# Altium footprint library chipfc_libs.PCBLIB: 337 footprints (part 3 of 22)
Each footprint in its own frame and in the unit in brackets; x right, y up, seen from the top. Pads: shape width x height; smd on the part's side, far side on the other; paste and mask are expansions set on the pad; w line width, h text height; cw(c..) or ccw(c..) is an arc to the next point about the centre after c.
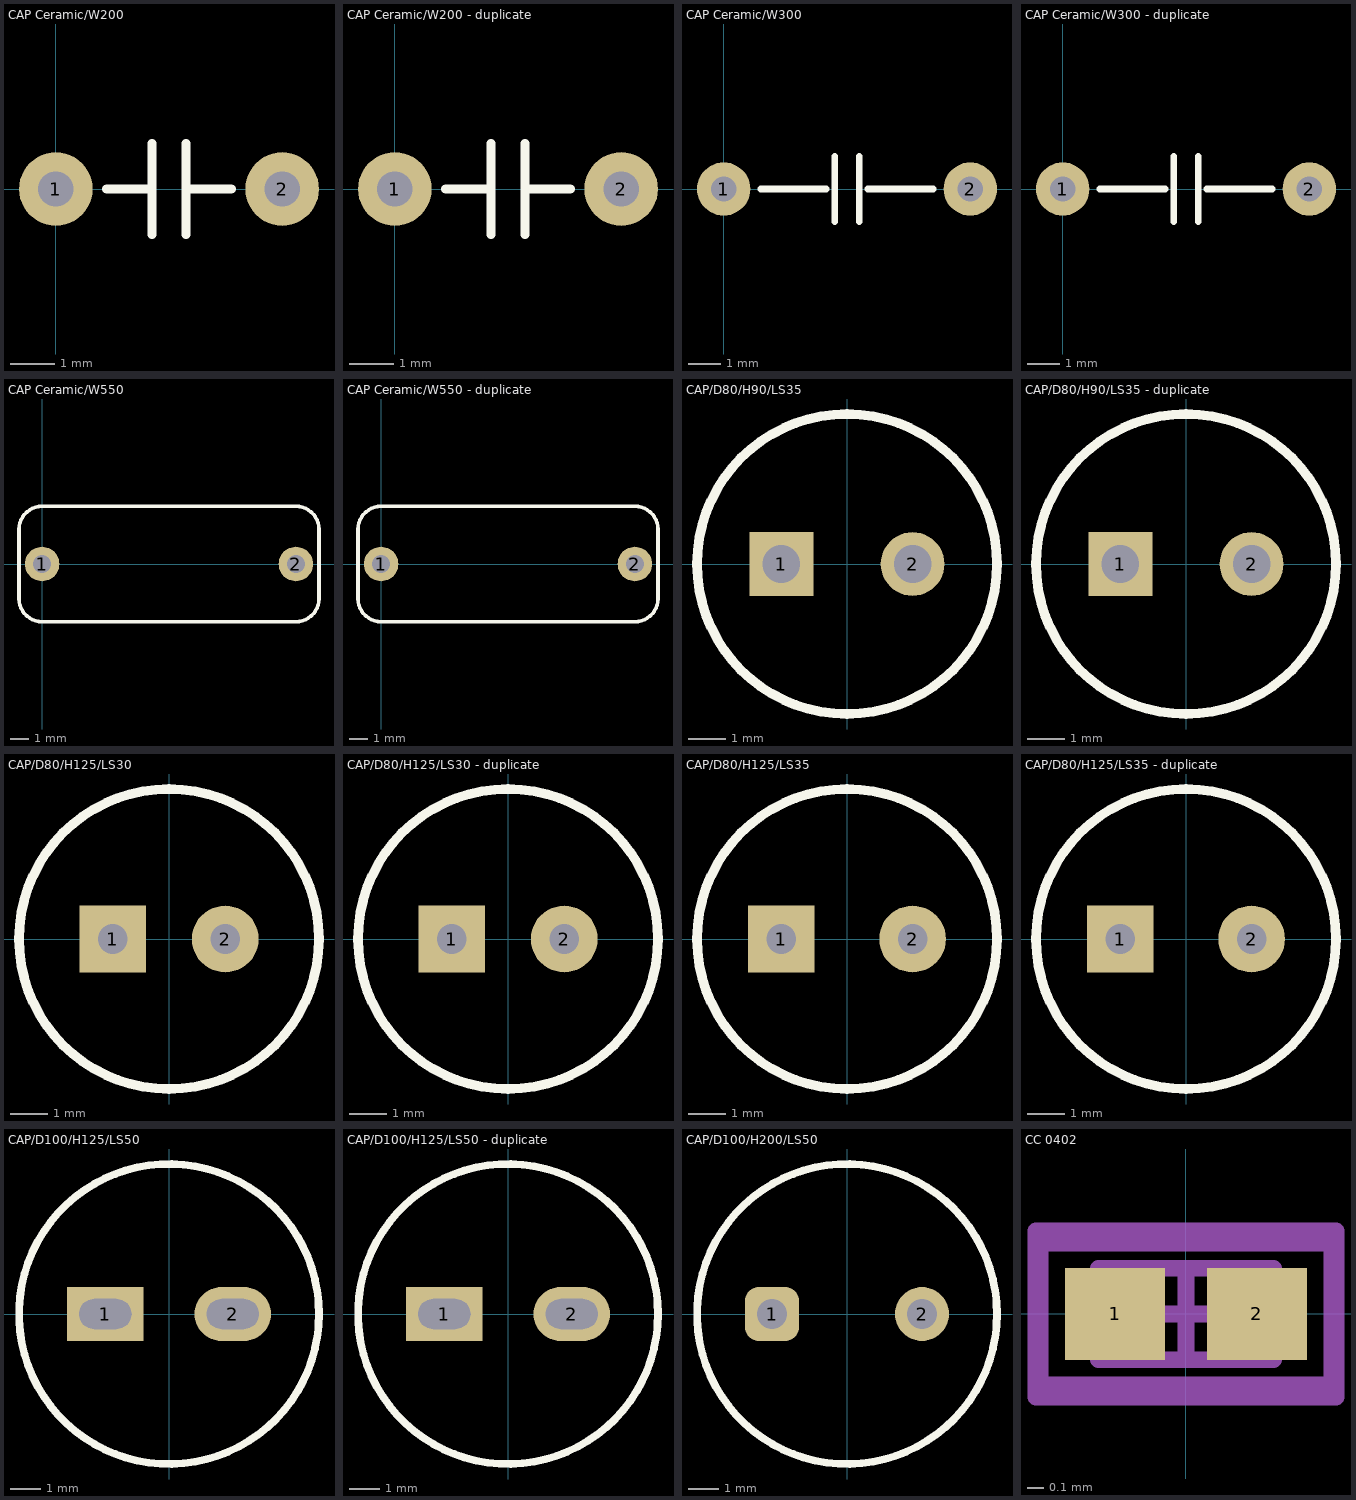
[diagram p2: the footprints below, top view; thin cyan lines are the x and y axes]

## CAP Ceramic/W200 [mil]
pads (2):
  round 65 hole 31: 1(0,0) 2(200,0)
Top Overlay:
  lines w8: 45,0 85,0 ; 85,-40 85,40 ; 115,-40 115,40 ; 115,0 155,0
3D body "User Library-CAP CERAMICO.step": height 180.55, standoff -35.1, extent -5.56,-41.67 205.5,41.01

## CAP Ceramic/W200 - duplicate [mil]
pads (2):
  round 65 hole 31: 1(0,0) 2(200,0)
Top Overlay:
  lines w8: 45,0 85,0 ; 85,-40 85,40 ; 115,-40 115,40 ; 115,0 155,0
3D body "User Library-CAP CERAMICO.step": height 180.55, standoff -35.1, extent -5.56,-41.67 205.5,41.01

## CAP Ceramic/W300 [mil]
pads (2):
  round 65 hole 31: 1(0,0) 2(300,0)
Top Overlay:
  lines w8: 45,0 125,0 ; 135,-40 135,40 ; 165,-40 165,40 ; 175,0 255,0
3D body "User Library-Panasonic ECK-A3D102KBP.step": height 339.84, standoff -180, extent -7.5,-47.15 307.5,47.16

## CAP Ceramic/W300 - duplicate [mil]
pads (2):
  round 65 hole 31: 1(0,0) 2(300,0)
Top Overlay:
  lines w8: 45,0 125,0 ; 135,-40 135,40 ; 165,-40 165,40 ; 175,0 255,0
3D body "User Library-Panasonic ECK-A3D102KBP.step": height 339.84, standoff -180, extent -7.5,-47.15 307.5,47.16

## CAP Ceramic/W550 [mil]
pads (2):
  round 75 hole 39: 1(0,0) 2(550,0)
Top Overlay:
  lines w8: -50,-75 ccw(c0,-75) 0,-125 550,-125 ccw(c550,-75) 600,-75 600,75 ccw(c550,75) 550,125 0,125 ccw(c0,75) -50,75 -50,-75

## CAP Ceramic/W550 - duplicate [mil]
pads (2):
  round 75 hole 39: 1(0,0) 2(550,0)
Top Overlay:
  lines w8: -50,-75 ccw(c0,-75) 0,-125 550,-125 ccw(c550,-75) 600,-75 600,75 ccw(c550,75) 550,125 0,125 ccw(c0,75) -50,75 -50,-75

## CAP/D80/H90/LS35 [mm] "Dia 8mm, Heigh 12.5mm, Lead Space 3mm (4.7uF/400V small)"
pads (2):
  rect 1.7x1.7 hole 1: 1(-1.75,0)
  round 1.7 hole 1: 2(1.75,0)
Top Overlay:
  circle w0.254: c0,0 r4
3D body "User Library-NIC_NRE-L221M10V8X9 _220MF_6_3V_Radial_Minature_Capacitor.step": height 9.91, standoff -3.17, extent -4.128,-4.127 4.127,4.128

## CAP/D80/H90/LS35 - duplicate [mm] "Dia 8mm, Heigh 12.5mm, Lead Space 3mm (4.7uF/400V small)"
pads (2):
  rect 1.7x1.7 hole 1: 1(-1.75,0)
  round 1.7 hole 1: 2(1.75,0)
Top Overlay:
  circle w0.254: c0,0 r4
3D body "User Library-NIC_NRE-L221M10V8X9 _220MF_6_3V_Radial_Minature_Capacitor.step": height 9.91, standoff -3.17, extent -4.128,-4.127 4.127,4.128

## CAP/D80/H125/LS30 [mil] "Dia 8mm, Heigh 12.5mm, Lead Space 3mm (4.7uF/400V small)"
pads (2):
  rect 70x70 hole 31: 1(-59.06,0)
  round 70 hole 31: 2(59.06,0)
Top Overlay:
  circle w10: c0,0 r157.48
3D body "User Library-CAP 8X11_5.STEP": height 454.24, standoff -746.06, extent -157.48,-157.48 157.48,157.48

## CAP/D80/H125/LS30 - duplicate [mil] "Dia 8mm, Heigh 12.5mm, Lead Space 3mm (4.7uF/400V small)"
pads (2):
  rect 70x70 hole 31: 1(-59.06,0)
  round 70 hole 31: 2(59.06,0)
Top Overlay:
  circle w10: c0,0 r157.48
3D body "User Library-CAP 8X11_5.STEP": height 454.24, standoff -746.06, extent -157.48,-157.48 157.48,157.48

## CAP/D80/H125/LS35 [mil] "Dia 8mm, Heigh 12.5mm, Lead Space 3.5mm (470uF/16V small)"
pads (2):
  rect 70x70 hole 31: 1(-68.9,0)
  round 70 hole 31: 2(68.9,0)
Top Overlay:
  circle w10: c0,0 r157.48
3D body "User Library-CAP 8X11_5.STEP": height 454.24, standoff -746.06, extent -157.48,-157.48 157.48,157.48

## CAP/D80/H125/LS35 - duplicate [mil] "Dia 8mm, Heigh 12.5mm, Lead Space 3.5mm (470uF/16V small)"
pads (2):
  rect 70x70 hole 31: 1(-68.9,0)
  round 70 hole 31: 2(68.9,0)
Top Overlay:
  circle w10: c0,0 r157.48
3D body "User Library-CAP 8X11_5.STEP": height 454.24, standoff -746.06, extent -157.48,-157.48 157.48,157.48

## CAP/D100/H125/LS50 [mm] "Dia 8mm, Heigh 12.5mm, Lead Space 3.5mm (470uF/16V small)"
pads (2):
  rect 2.55x1.8 hole 1 slot 1.75 at 0 deg: 1(-2.125,0)
  oval 2.55x1.8 hole 1 slot 1.75 at 0 deg: 2(2.125,0)
Top Overlay:
  circle w0.254: c0,0 r5
3D body "User Library-Cap electro 10x12_5x5_0mm.step": height 12.78, standoff -3.73, extent -5.025,-5.025 5.026,5.026

## CAP/D100/H125/LS50 - duplicate [mm] "Dia 8mm, Heigh 12.5mm, Lead Space 3.5mm (470uF/16V small)"
pads (2):
  rect 2.55x1.8 hole 1 slot 1.75 at 0 deg: 1(-2.125,0)
  oval 2.55x1.8 hole 1 slot 1.75 at 0 deg: 2(2.125,0)
Top Overlay:
  circle w0.254: c0,0 r5
3D body "User Library-Cap electro 10x12_5x5_0mm.step": height 12.78, standoff -3.73, extent -5.025,-5.025 5.026,5.026

## CAP/D100/H200/LS50 [mm] "Dia 8mm, Heigh 12.5mm, Lead Space 3.5mm (470uF/16V small)"
pads (2):
  rrect50% 1.8x1.8 hole 1: 1(-2.5,0)
  round 1.8 hole 1: 2(2.5,0)
Top Overlay:
  circle w0.254: c0,0 r5
3D body "User Library-Cap-EL(10x20-5).step": height 20, standoff -3.3, extent -5,-5 5.002,5

## CC 0402 [mm] "Chip Capacitor, 2-Leads, Body 1.0x0.5mm, IPC Medium Density"
height 0.55
pads (2):
  rect 0.6x0.55 smd: 1(-0.425,0) 2(0.425,0)
Mechanical 13:
  lines w0.1: -0.525,-0.275 0.525,-0.275 0.525,0.275 -0.525,0.275 -0.525,-0.275
Mechanical 15:
  lines w0.1: -0.275,0 0.275,0 ; 0,-0.275 0,0.275 ; -0.875,-0.425 0.875,-0.425 0.875,0.425 -0.875,0.425 -0.875,-0.425
Mechanical 31:
  lines w0.1: -0.9,-0.5 0.9,-0.5 0.9,0.5 -0.9,0.5 -0.9,-0.5
3D body "User Library-CAPC1005X06.step": height 0.6, standoff 0, extent -0.5,-0.25 0.5,0.25